# Altium footprint library TH Capasitor.PcbLib: 36 footprints (part 3 of 3)
Each footprint in its own frame and in the unit in brackets; x right, y up, seen from the top. Pads: shape width x height; smd on the part's side, far side on the other; paste and mask are expansions set on the pad; w line width, h text height; cw(c..) or ccw(c..) is an arc to the next point about the centre after c.
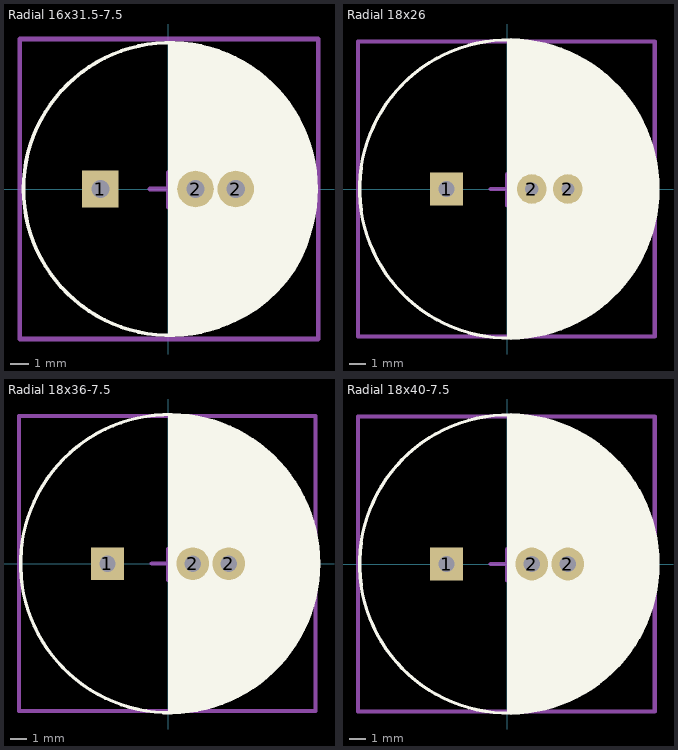
[diagram p2: the footprints below, top view; thin cyan lines are the x and y axes]

## Radial 16x31.5-7.5 [mm] "Cap electrolitic radial 16x31.5-7.5-Design:Abbas Basereh"
height 31.5
pads (3):
  rect 2x2 hole 1: 1(-3.7,0)
  round 2 hole 1: 2(1.5,0) 2(3.7,0)
Top Overlay:
  circle w0.2: c0.096,0 r8
  region: 0,8.001 0.394,8.007 1.179,7.941 1.953,7.798 2.71,7.579 3.441,7.286 4.14,6.922 4.799,6.491 5.413,5.996 5.974,5.444 6.478,4.838 6.92,4.186 7.295,3.493 7.599,2.767 7.83,2.013 7.986,1.241 8.064,0.457 8.064,0.063 8.089,-0.301 8.068,-1.033 7.974,-1.759 7.81,-2.472 7.577,-3.165 7.277,-3.832 6.913,-4.467 6.488,-5.063 6.007,-5.615 5.475,-6.116 4.895,-6.563 4.275,-6.951 3.62,-7.277 2.936,-7.536 2.23,-7.728 1.508,-7.849 1.143,-7.874 0,-8.001
  lines w0.1: 0.9,-7.9 0.9,-7.9
Mechanical 15:
  lines w0.254: -1,0 1,0 ; 0,-1 0,0.9 ; -8.1,-8.2 -8.1,8.2 8.2,8.2 8.2,-8.2 -8.1,-8.2
3D body "User Library-Cap-EL(16x31_5-7_5)T.STEP": height 41.2, standoff -2.8, extent -8,-8 8.002,8

## Radial 18x26 [mm] "Cap electrolitic radial 18x26-Design:Abbas Basereh"
height 26
pads (3):
  rect 2x2 hole 1: 1(-3.7,0)
  round 1.8 hole 0.8: 2(1.5,0) 2(3.7,0)
Top Overlay:
  circle w0.2: c0.096,0 r9.1
  region: 0,9.1 0.096,9.1 0.543,9.1 1.433,9.012 2.31,8.838 3.165,8.578 3.991,8.236 4.78,7.815 5.523,7.318 6.215,6.751 6.847,6.119 7.414,5.427 7.911,4.684 8.332,3.895 8.674,3.069 8.934,2.214 9.108,1.337 9.196,0.447 9.196,0 9.196,-0.447 9.108,-1.337 8.934,-2.214 8.674,-3.069 8.332,-3.895 7.911,-4.684 7.414,-5.427 6.847,-6.119 6.215,-6.751 5.523,-7.318 4.78,-7.815 3.991,-8.236 3.165,-8.578 2.31,-8.838 1.433,-9.012 0.543,-9.1 0.096,-9.1 0,-9.1
Mechanical 15:
  lines w0.254: -1,0 1,0 ; 0,-1 0,0.9 ; -9.1,-9 9,-9 9,9 -9.1,9 -9.1,-9
3D body "User Library-Cap-EL(18x26-7_5)T.STEP": height 27, standoff -3, extent -9,-8.999 9.002,8.999

## Radial 18x36-7.5 [mm] "Cap electrolitic radial 18x36-7.5-Design:Abbas Basereh"
height 36
pads (3):
  rect 2x2 hole 1: 1(-3.7,0)
  round 2 hole 1: 2(1.5,0) 2(3.7,0)
Top Overlay:
  circle w0.2: c0.096,0 r9.1
  region: 0.012,9.056 0.108,9.056 0.555,9.056 1.445,8.968 2.322,8.794 3.178,8.534 4.004,8.192 4.792,7.771 5.536,7.274 6.227,6.707 6.859,6.075 7.426,5.383 7.923,4.64 8.344,3.851 8.687,3.025 8.946,2.17 9.121,1.293 9.208,0.403 9.208,-0.044 9.208,-0.491 9.121,-1.381 8.946,-2.258 8.687,-3.113 8.344,-3.939 7.923,-4.728 7.426,-5.471 6.859,-6.163 6.227,-6.795 5.536,-7.362 4.792,-7.859 4.004,-8.28 3.178,-8.622 2.322,-8.882 1.445,-9.056 0.555,-9.144 0.108,-9.144 0.012,-9.144
Mechanical 15:
  lines w0.254: -1,0 1,0 ; 0,-1 0,0.9 ; -9.1,-9 9,-9 9,9 -9.1,9 -9.1,-9
3D body "User Library-Cap-EL(18x36-7_5)T.STEP": height 37, standoff -3, extent -9,-9 9.002,9

## Radial 18x40-7.5 [mm] "Cap electrolitic radial 18x40-7.5-Design:Abbas Basereh"
height 40
pads (3):
  rect 2x2 hole 1: 1(-3.7,0)
  round 2 hole 1: 2(1.5,0) 2(3.7,0)
Top Overlay:
  circle w0.2: c0.096,0 r9.1
  region: 0.004,9.1 0.1,9.1 0.547,9.1 1.437,9.012 2.314,8.838 3.169,8.578 3.995,8.236 4.784,7.815 5.527,7.318 6.219,6.751 6.851,6.119 7.418,5.427 7.915,4.684 8.336,3.895 8.678,3.069 8.938,2.214 9.112,1.337 9.2,0.447 9.2,0 9.2,-0.447 9.112,-1.337 8.938,-2.214 8.678,-3.069 8.336,-3.895 7.915,-4.684 7.418,-5.427 6.851,-6.119 6.219,-6.751 5.527,-7.318 4.784,-7.815 3.995,-8.236 3.169,-8.578 2.314,-8.838 1.437,-9.012 0.547,-9.1 0.1,-9.1 0.004,-9.1
Mechanical 15:
  lines w0.254: -1,0 1,0 ; 0,-1 0,0.9 ; -9.1,-9 -9.1,9 9,9 9,-9 -9.1,-9
3D body "User Library-Cap-EL(18x40-7_5)T.STEP": height 41, standoff -3, extent -9,-8.999 9.002,9